# Altium footprint library SAMTEC THD.PcbLib: 161 footprints (part 9 of 12) (continued)
## SAMTEC_TSW-105-07-L-D-LL [mm] "10 Contacts, Pitch 2.54mm - Dual Row, Through Mount Straigh Header"
height 11.05
pads (10):
  round 1.7 hole 1: 1(-5.08,-1.27) 2(-5.08,1.27) 3(-2.54,-1.27) 4(-2.54,1.27) 5(0,-1.27) 6(0,1.27) 7(2.54,-1.27) 8(2.54,1.27) 9(5.08,-1.27) 10(5.08,1.27)
Top Overlay:
  circle w0.3: c-5.045,-3.135 r0.15
  lines w0.2: -6.35,-2.54 -6.35,2.54 ; -6.35,-2.54 -6.35,2.54 ; -6.35,-2.54 -4.064,-2.54 -4.064,-2.032 -3.556,-2.032 -3.556,-2.54 -1.524,-2.54 -1.524,-2.032 -1.016,-2.032 -1.016,-2.54 1.016,-2.54 1.016,-2.032 1.524,-2.032 1.524,-2.54 3.556,-2.54 3.556,-2.032 4.064,-2.032 4.064,-2.54 6.35,-2.54 ; -6.35,2.54 -4.064,2.54 -4.064,2.032 -3.556,2.032 -3.556,2.54 -1.524,2.54 -1.524,2.032 -1.016,2.032 -1.016,2.54 1.016,2.54 1.016,2.032 1.524,2.032 1.524,2.54 3.556,2.54 3.556,2.032 4.064,2.032 4.064,2.54 6.35,2.54 ; 6.35,-2.54 6.35,2.54 ; 6.35,-2.54 6.35,2.54
  text "1" at -7.327,-1.768 h1.2
Mechanical 8:
  lines w0.1: -5.58,-1.27 -5.08,-1.27 ; -5.58,1.27 -5.08,1.27 ; -5.08,-1.77 -5.08,-1.27 ; -5.08,-0.77 -5.08,-1.27 ; -5.08,0.77 -5.08,1.27 ; -5.08,1.77 -5.08,1.27 ; -4.58,-1.27 -5.08,-1.27 ; -4.58,1.27 -5.08,1.27 ; -3.04,-1.27 -2.54,-1.27 ; -3.04,1.27 -2.54,1.27 ; -2.54,-1.77 -2.54,-1.27 ; -2.54,-0.77 -2.54,-1.27 ; -2.54,0.77 -2.54,1.27 ; -2.54,1.77 -2.54,1.27 ; -2.04,-1.27 -2.54,-1.27 ; -2.04,1.27 -2.54,1.27 ; -0.5,-1.27 0,-1.27 ; -0.5,0 0,0 ; -0.5,1.27 0,1.27 ; 0,-1.77 0,-1.27 ; 0,-0.77 0,-1.27 ; 0,-0.5 0,0 ; 0,0.5 0,0 ; 0,0.77 0,1.27 ; 0,1.77 0,1.27 ; 0.5,-1.27 0,-1.27 ; 0.5,0 0,0 ; 0.5,1.27 0,1.27 ; 2.04,-1.27 2.54,-1.27 ; 2.04,1.27 2.54,1.27 ; 2.54,-1.77 2.54,-1.27 ; 2.54,-0.77 2.54,-1.27 ; 2.54,0.77 2.54,1.27 ; 2.54,1.77 2.54,1.27 ; 3.04,-1.27 2.54,-1.27 ; 3.04,1.27 2.54,1.27 ; 4.58,-1.27 5.08,-1.27 ; 4.58,1.27 5.08,1.27 ; 5.08,-1.77 5.08,-1.27 ; 5.08,-0.77 5.08,-1.27 ; 5.08,0.77 5.08,1.27 ; 5.08,1.77 5.08,1.27 ; 5.58,-1.27 5.08,-1.27 ; 5.58,1.27 5.08,1.27
Mechanical 14:
  drawing of 158 lines, arcs and shapes, not listed
  text "1" at -7.327,-1.768 h1.2
3D body "SAMTEC_TSW-105-07-L-D-LL.stp": height 8.38, standoff -2.54, extent -6.35,-2.54 6.35,2.54

## SAMTEC_TSW-105-23-L-D [mm] "10 Contacts - Pitch 2.54mm - Dual Row  Through Mount Straigh Header (Post Lead 5.84mm, Tail Lead 2.92mm, Insulator 2.54mm)"
height 8.38
pads (10):
  round 1.7 hole 1: 1(-5.08,-1.27) 2(-5.08,1.27) 3(-2.54,-1.27) 4(-2.54,1.27) 5(0,-1.27) 6(0,1.27) 7(2.54,-1.27) 8(2.54,1.27) 9(5.08,-1.27) 10(5.08,1.27)
Top Overlay:
  circle w0.3: c-5.045,-3.135 r0.15
  lines w0.2: -6.35,-2.54 -6.35,2.54 -4.064,2.54 -4.064,2.286 -3.556,2.286 -3.556,2.54 -1.524,2.54 -1.524,2.286 -1.016,2.286 -1.016,2.54 1.016,2.54 1.016,2.286 1.524,2.286 1.524,2.54 3.556,2.54 3.556,2.286 4.064,2.286 4.064,2.54 6.35,2.54 6.35,-2.54 4.064,-2.54 4.064,-2.286 3.556,-2.286 3.556,-2.54 1.524,-2.54 1.524,-2.286 1.016,-2.286 1.016,-2.54 -1.016,-2.54 -1.016,-2.286 -1.524,-2.286 -1.524,-2.54 -3.556,-2.54 -3.556,-2.286 -4.064,-2.286 -4.064,-2.54 -6.35,-2.54
  text "1" at -7.452,-1.768 h1.2
Mechanical 8:
  lines w0.05: -5.58,-1.27 -5.08,-1.27 ; -5.58,1.27 -5.08,1.27 ; -5.08,-1.77 -5.08,-1.27 ; -5.08,-0.77 -5.08,-1.27 ; -5.08,0.77 -5.08,1.27 ; -5.08,1.77 -5.08,1.27 ; -4.58,-1.27 -5.08,-1.27 ; -4.58,1.27 -5.08,1.27 ; -3.04,-1.27 -2.54,-1.27 ; -3.04,1.27 -2.54,1.27 ; -2.54,-1.77 -2.54,-1.27 ; -2.54,-0.77 -2.54,-1.27 ; -2.54,0.77 -2.54,1.27 ; -2.54,1.77 -2.54,1.27 ; -2.04,-1.27 -2.54,-1.27 ; -2.04,1.27 -2.54,1.27 ; -0.5,-1.27 0,-1.27 ; -0.5,0 0,0 ; -0.5,1.27 0,1.27 ; 0,-1.77 0,-1.27 ; 0,-0.77 0,-1.27 ; 0,-0.5 0,0 ; 0,0.5 0,0 ; 0,0.77 0,1.27 ; 0,1.77 0,1.27 ; 0.5,-1.27 0,-1.27 ; 0.5,0 0,0 ; 0.5,1.27 0,1.27 ; 2.04,-1.27 2.54,-1.27 ; 2.04,1.27 2.54,1.27 ; 2.54,-1.77 2.54,-1.27 ; 2.54,-0.77 2.54,-1.27 ; 2.54,0.77 2.54,1.27 ; 2.54,1.77 2.54,1.27 ; 3.04,-1.27 2.54,-1.27 ; 3.04,1.27 2.54,1.27 ; 4.58,-1.27 5.08,-1.27 ; 4.58,1.27 5.08,1.27 ; 5.08,-1.77 5.08,-1.27 ; 5.08,-0.77 5.08,-1.27 ; 5.08,0.77 5.08,1.27 ; 5.08,1.77 5.08,1.27 ; 5.58,-1.27 5.08,-1.27 ; 5.58,1.27 5.08,1.27
Mechanical 14:
  lines w0.1: -4.064,-2.286 -3.556,-2.286 ; -4.064,-0.508 -3.556,-0.508 ; -4.064,0.508 -3.556,0.508 ; -4.064,2.286 -3.556,2.286 ; -1.524,-2.286 -1.016,-2.286 ; -1.524,-0.508 -1.016,-0.508 ; -1.524,0.508 -1.016,0.508 ; -1.524,2.286 -1.016,2.286 ; 1.016,-2.286 1.524,-2.286 ; 1.016,-0.508 1.524,-0.508 ; 1.016,0.508 1.524,0.508 ; 1.016,2.286 1.524,2.286 ; 3.556,-2.286 4.064,-2.286 ; 3.556,-0.508 4.064,-0.508 ; 3.556,0.508 4.064,0.508 ; 3.556,2.286 4.064,2.286 ; -6.35,-2.54 -4.064,-2.54 -4.064,2.54 -6.35,2.54 -6.35,-2.54 ; -3.556,-2.54 -1.524,-2.54 -1.524,2.54 -3.556,2.54 -3.556,-2.54 ; -1.016,-2.54 1.016,-2.54 1.016,2.54 -1.016,2.54 -1.016,-2.54 ; 1.524,-2.54 3.556,-2.54 3.556,2.54 1.524,2.54 1.524,-2.54 ; 4.064,-2.54 6.35,-2.54 6.35,2.54 4.064,2.54 4.064,-2.54
3D body "SAMTEC_TSW-105-23-L-D.stp": height 8.38, standoff -2.92, extent -6.35,-2.54 6.35,2.54

## SAMTEC_TSW-105-23-L-S [mm] "5 Contacts - Pitch 2.54mm - Single Row  Through Mount Straigh Header (Post Lead 5.84mm, Tail Lead 2.92mm, Insulator 2.54mm)"
height 8.38
pads (5):
  rect 1.7x1.7 hole 1: 1(0,0)
  round 1.7 hole 1: 2(2.54,0) 3(5.08,0) 4(7.62,0) 5(10.16,0)
Top Overlay:
  circle w0.3: c-0.508,1.778 r0.15
  lines w0.2: 1.007,-1.2 1.007,-1.27 ; 1.007,1.2 1.007,1.27 ; 1.2,-0.762 1.533,-0.762 1.533,-1.27 3.547,-1.27 3.547,-0.762 4.073,-0.762 4.073,-1.27 6.087,-1.27 6.087,-0.762 6.613,-0.762 6.613,-1.27 8.627,-1.27 8.627,-0.762 ; 1.2,0.762 1.533,0.762 1.533,1.27 3.547,1.27 3.547,0.762 4.073,0.762 4.073,1.27 6.087,1.27 6.087,0.762 6.613,0.762 6.613,1.27 8.627,1.27 8.627,0.762 ; -1.27,-1.27 1.007,-1.27 ; -1.27,-1.27 -1.27,1.27 ; -1.27,-1.27 -1.27,1.27 ; -1.27,-1.27 1.007,-1.27 ; -1.27,1.27 1.007,1.27 ; -1.27,1.27 1.007,1.27 ; 8.627,-0.762 9.153,-0.762 ; 8.627,-0.762 9.153,-0.762 ; 8.627,0.762 9.153,0.762 ; 8.627,0.762 9.153,0.762 ; 9.153,-0.762 9.153,-1.27 11.43,-1.27 11.43,1.27 9.153,1.27 9.153,0.762
Mechanical 8:
  lines w0.1: -0.5,0 0,0 ; 0,-0.5 0,0 ; 0,0.5 0,0 ; 0.5,0 0,0 ; 2.04,0 2.54,0 ; 2.54,-0.5 2.54,0 ; 2.54,0.5 2.54,0 ; 3.04,0 2.54,0 ; 4.58,0 5.08,0 ; 5.08,-0.5 5.08,0 ; 5.08,0.5 5.08,0 ; 5.58,0 5.08,0 ; 7.12,0 7.62,0 ; 7.62,-0.5 7.62,0 ; 7.62,0.5 7.62,0 ; 8.12,0 7.62,0 ; 9.66,0 10.16,0 ; 10.16,-0.5 10.16,0 ; 10.16,0.5 10.16,0 ; 10.66,0 10.16,0
Mechanical 14:
  circle w0.3: c-0.508,1.778 r0.15
  lines w0.1: 1.007,-0.762 1.533,-0.762 ; 1.007,0.762 1.533,0.762 ; 3.547,-0.762 4.073,-0.762 ; 3.547,0.762 4.073,0.762 ; 6.087,-0.762 6.613,-0.762 ; 6.087,0.762 6.613,0.762 ; -1.27,-1.27 -1.27,1.27 1.007,1.27 1.007,-1.27 -1.27,-1.27 ; -0.317,-0.318 -0.318,0.317 0.317,0.317 0.318,-0.317 -0.317,-0.318 ; 1.533,-1.27 3.547,-1.27 3.547,1.27 1.533,1.27 1.533,-1.27 ; 2.223,-0.318 2.222,0.317 2.857,0.317 2.857,-0.317 2.223,-0.318 ; 4.073,-1.27 4.073,1.27 6.087,1.27 6.087,-1.27 4.073,-1.27 ; 4.763,-0.318 4.763,0.317 5.397,0.317 5.397,-0.317 4.763,-0.318 ; 6.613,-1.27 6.613,1.27 8.627,1.27 8.627,-1.27 6.613,-1.27 ; 7.303,-0.318 7.302,0.317 7.937,0.317 7.938,-0.317 7.303,-0.318 ; 8.627,-0.762 9.153,-0.762 8.627,-0.762 ; 8.627,0.762 9.153,0.762 8.627,0.762 ; 9.153,-1.27 9.153,1.27 11.43,1.27 11.43,-1.27 9.153,-1.27 ; 9.843,-0.318 9.843,0.317 10.478,0.317 10.478,-0.318 9.843,-0.318
3D body "SAMTEC_TSW-105-23-L-S.stp": height 8.38, standoff -2.92, extent -1.27,-1.27 11.43,1.27

## SAMTEC_TSW-106-22-L-D-RA [mm] "12 Contacts - Pitch 2.54mm - Dual Row Through Mount  Right Angle Header (Post Lead 5.84mm, Tail Lead 4.84mm)"
height 5.56
pads (12):
  round 1.7 hole 1: 1(-6.35,-1.27) 2(-6.35,1.27) 3(-3.81,-1.27) 4(-3.81,1.27) 5(-1.27,-1.27) 6(-1.27,1.27) 7(1.27,-1.27) 8(1.27,1.27) 9(3.81,-1.27) 10(3.81,1.27) 11(6.35,-1.27) 12(6.35,1.27)
Top Overlay:
  circle w0.3: c-6.315,-3.135 r0.15
  lines w0.2: -6.667,2.479 -6.667,3.302 ; -6.667,5.334 -6.667,11.176 -6.032,11.176 -6.032,5.334 ; -6.032,2.479 -6.032,3.302 ; -5.344,3.581 -4.816,3.581 ; -5.344,5.055 -4.816,5.055 ; -4.127,2.479 -4.127,3.302 ; -4.127,5.334 -4.127,11.176 -3.492,11.176 -3.492,5.334 ; -3.492,2.479 -3.492,3.302 ; -2.804,3.581 -2.276,3.581 ; -2.804,5.055 -2.276,5.055 ; -1.587,2.479 -1.587,3.302 ; -1.587,5.334 -1.587,11.176 -0.952,11.176 -0.952,5.334 ; -0.952,2.479 -0.952,3.302 ; -0.264,3.581 0.264,3.581 ; -0.264,5.055 0.264,5.055 ; 0.953,2.479 0.953,3.302 ; 0.953,5.334 0.953,11.176 1.588,11.176 1.588,5.334 ; 1.588,2.479 1.588,3.302 ; 2.276,3.581 2.804,3.581 ; 2.276,5.055 2.804,5.055 ; 3.493,2.479 3.493,3.302 ; 3.493,5.334 3.493,11.176 4.128,11.176 4.128,5.334 ; 4.128,2.479 4.128,3.302 ; 4.816,3.581 5.344,3.581 ; 4.816,5.055 5.344,5.055 ; 6.033,2.479 6.033,3.302 ; 6.033,5.334 6.033,11.176 6.668,11.176 6.668,5.334 ; 6.668,2.479 6.668,3.302 ; -7.62,3.302 -7.356,3.302 -7.356,2.794 -6.924,2.794 -6.924,3.302 -5.776,3.302 -5.776,2.794 -5.344,2.794 -5.344,5.334 -7.62,5.334 -7.62,3.302 ; -4.816,2.794 -4.384,2.794 -4.384,3.302 -3.236,3.302 -3.236,2.794 -2.804,2.794 -2.804,5.334 -4.816,5.334 -4.816,2.794 ; -2.276,2.794 -1.844,2.794 -1.844,3.302 -0.696,3.302 -0.696,2.794 -0.264,2.794 -0.264,5.334 -2.276,5.334 -2.276,2.794 ; 0.264,2.794 0.696,2.794 0.696,3.302 1.844,3.302 1.844,2.794 2.276,2.794 2.276,5.334 0.264,5.334 0.264,2.794 ; 2.804,2.794 3.236,2.794 3.236,3.302 4.384,3.302 4.384,2.794 4.816,2.794 4.816,5.334 2.804,5.334 2.804,2.794 ; 5.344,2.794 5.776,2.794 5.776,3.302 6.924,3.302 6.924,2.794 7.356,2.794 7.356,3.302 7.62,3.302 7.62,5.334 5.344,5.334 5.344,2.794
  text "1" at -8.597,-1.768 h1.2
Mechanical 8:
  lines w0.1: -6.85,-1.27 -6.35,-1.27 ; -6.85,1.27 -6.35,1.27 ; -6.35,-1.77 -6.35,-1.27 ; -6.35,-0.77 -6.35,-1.27 ; -6.35,0.77 -6.35,1.27 ; -6.35,1.77 -6.35,1.27 ; -5.85,-1.27 -6.35,-1.27 ; -5.85,1.27 -6.35,1.27 ; -4.31,-1.27 -3.81,-1.27 ; -4.31,1.27 -3.81,1.27 ; -3.81,-1.77 -3.81,-1.27 ; -3.81,-0.77 -3.81,-1.27 ; -3.81,0.77 -3.81,1.27 ; -3.81,1.77 -3.81,1.27 ; -3.31,-1.27 -3.81,-1.27 ; -3.31,1.27 -3.81,1.27 ; -1.77,-1.27 -1.27,-1.27 ; -1.77,1.27 -1.27,1.27 ; -1.27,-1.77 -1.27,-1.27 ; -1.27,-0.77 -1.27,-1.27 ; -1.27,0.77 -1.27,1.27 ; -1.27,1.77 -1.27,1.27 ; -0.77,-1.27 -1.27,-1.27 ; -0.77,1.27 -1.27,1.27 ; -0.5,0 0,0 ; 0,-0.5 0,0 ; 0,0.5 0,0 ; 0.5,0 0,0 ; 0.77,-1.27 1.27,-1.27 ; 0.77,1.27 1.27,1.27 ; 1.27,-1.77 1.27,-1.27 ; 1.27,-0.77 1.27,-1.27 ; 1.27,0.77 1.27,1.27 ; 1.27,1.77 1.27,1.27 ; 1.77,-1.27 1.27,-1.27 ; 1.77,1.27 1.27,1.27 ; 3.31,-1.27 3.81,-1.27 ; 3.31,1.27 3.81,1.27 ; 3.81,-1.77 3.81,-1.27 ; 3.81,-0.77 3.81,-1.27 ; 3.81,0.77 3.81,1.27 ; 3.81,1.77 3.81,1.27 ; 4.31,-1.27 3.81,-1.27 ; 4.31,1.27 3.81,1.27 ; 5.85,-1.27 6.35,-1.27 ; 5.85,1.27 6.35,1.27 ; 6.35,-1.77 6.35,-1.27 ; 6.35,-0.77 6.35,-1.27 ; 6.35,0.77 6.35,1.27 ; 6.35,1.77 6.35,1.27 ; 6.85,-1.27 6.35,-1.27 ; 6.85,1.27 6.35,1.27
Mechanical 14:
  circle w0.3: c-6.315,-3.135 r0.15
  lines w0.1: -6.667,3.302 -6.667,-1.587 -6.032,-1.587 -6.032,3.302 ; -6.667,5.334 -6.667,11.176 -6.032,11.176 -6.032,5.334 ; -5.344,3.581 -4.816,3.581 ; -5.344,5.055 -4.816,5.055 ; -4.127,3.302 -4.127,-1.587 -3.492,-1.587 -3.492,3.302 ; -4.127,5.334 -4.127,11.176 -3.492,11.176 -3.492,5.334 ; -2.804,3.581 -2.276,3.581 ; -2.804,5.055 -2.276,5.055 ; -1.587,3.302 -1.587,-1.587 -0.952,-1.587 -0.952,3.302 ; -1.587,5.334 -1.587,11.176 -0.952,11.176 -0.952,5.334 ; -0.264,3.581 0.264,3.581 ; -0.264,5.055 0.264,5.055 ; 0.953,3.302 0.953,-1.587 1.588,-1.587 1.588,3.302 ; 0.953,5.334 0.953,11.176 1.588,11.176 1.588,5.334 ; 2.276,3.581 2.804,3.581 ; 2.276,5.055 2.804,5.055 ; 3.493,3.302 3.493,-1.587 4.128,-1.587 4.128,3.302 ; 3.493,5.334 3.493,11.176 4.128,11.176 4.128,5.334 ; 4.816,3.581 5.344,3.581 ; 4.816,5.055 5.344,5.055 ; 6.033,3.302 6.033,-1.587 6.668,-1.587 6.668,3.302 ; 6.033,5.334 6.033,11.176 6.668,11.176 6.668,5.334 ; -7.62,3.302 -7.356,3.302 -7.356,2.794 -6.924,2.794 -6.924,3.302 -5.776,3.302 -5.776,2.794 -5.344,2.794 -5.344,5.334 -7.62,5.334 -7.62,3.302 ; -4.816,2.794 -4.384,2.794 -4.384,3.302 -3.236,3.302 -3.236,2.794 -2.804,2.794 -2.804,5.334 -4.816,5.334 -4.816,2.794 ; -2.276,2.794 -1.844,2.794 -1.844,3.302 -0.696,3.302 -0.696,2.794 -0.264,2.794 -0.264,5.334 -2.276,5.334 -2.276,2.794 ; 0.264,2.794 0.696,2.794 0.696,3.302 1.844,3.302 1.844,2.794 2.276,2.794 2.276,5.334 0.264,5.334 0.264,2.794 ; 2.804,2.794 3.236,2.794 3.236,3.302 4.384,3.302 4.384,2.794 4.816,2.794 4.816,5.334 2.804,5.334 2.804,2.794 ; 5.344,2.794 5.776,2.794 5.776,3.302 6.924,3.302 6.924,2.794 7.356,2.794 7.356,3.302 7.62,3.302 7.62,5.334 5.344,5.334 5.344,2.794
  text "1" at -8.597,-1.768 h1.2
3D body "SAMTEC_TSW-106-22-L-D-RA.stp": height 5.59, standoff -4.83, extent -7.62,-1.587 7.62,11.176

## SAMTEC_TSW-106-23-L-D [mm] "12 Contacts - Pitch 2.54mm - Dual Row  Through Mount Straigh Header (Post Lead 5.84mm, Tail Lead 2.92mm, Insulator 2.54mm)"
height 8.38
pads (12):
  round 1.7 hole 1: 1(-6.35,-1.27) 2(-6.35,1.27) 3(-3.81,-1.27) 4(-3.81,1.27) 5(-1.27,-1.27) 6(-1.27,1.27) 7(1.27,-1.27) 8(1.27,1.27) 9(3.81,-1.27) 10(3.81,1.27) 11(6.35,-1.27) 12(6.35,1.27)
Top Overlay:
  circle w0.3: c-6.315,-3.135 r0.15
  lines w0.2: -7.62,-2.54 -7.62,2.54 -5.334,2.54 -5.334,2.286 -4.826,2.286 -4.826,2.54 -2.794,2.54 -2.794,2.286 -2.286,2.286 -2.286,2.54 -0.254,2.54 -0.254,2.286 0.254,2.286 0.254,2.54 2.286,2.54 2.286,2.286 2.794,2.286 2.794,2.54 4.826,2.54 4.826,2.286 5.334,2.286 5.334,2.54 7.62,2.54 7.62,-2.54 5.334,-2.54 5.334,-2.286 4.826,-2.286 4.826,-2.54 2.794,-2.54 2.794,-2.286 2.286,-2.286 2.286,-2.54 0.254,-2.54 0.254,-2.286 -0.254,-2.286 -0.254,-2.54 -2.286,-2.54 -2.286,-2.286 -2.794,-2.286 -2.794,-2.54 -4.826,-2.54 -4.826,-2.286 -5.334,-2.286 -5.334,-2.54 -7.62,-2.54
  text "1" at -8.722,-1.768 h1.2
Mechanical 8:
  lines w0.05: -6.85,-1.27 -6.35,-1.27 ; -6.85,1.27 -6.35,1.27 ; -6.35,-1.77 -6.35,-1.27 ; -6.35,-0.77 -6.35,-1.27 ; -6.35,0.77 -6.35,1.27 ; -6.35,1.77 -6.35,1.27 ; -5.85,-1.27 -6.35,-1.27 ; -5.85,1.27 -6.35,1.27 ; -4.31,-1.27 -3.81,-1.27 ; -4.31,1.27 -3.81,1.27 ; -3.81,-1.77 -3.81,-1.27 ; -3.81,-0.77 -3.81,-1.27 ; -3.81,0.77 -3.81,1.27 ; -3.81,1.77 -3.81,1.27 ; -3.31,-1.27 -3.81,-1.27 ; -3.31,1.27 -3.81,1.27 ; -1.77,-1.27 -1.27,-1.27 ; -1.77,1.27 -1.27,1.27 ; -1.27,-1.77 -1.27,-1.27 ; -1.27,-0.77 -1.27,-1.27 ; -1.27,0.77 -1.27,1.27 ; -1.27,1.77 -1.27,1.27 ; -0.77,-1.27 -1.27,-1.27 ; -0.77,1.27 -1.27,1.27 ; -0.5,0 0,0 ; 0,-0.5 0,0 ; 0,0.5 0,0 ; 0.5,0 0,0 ; 0.77,-1.27 1.27,-1.27 ; 0.77,1.27 1.27,1.27 ; 1.27,-1.77 1.27,-1.27 ; 1.27,-0.77 1.27,-1.27 ; 1.27,0.77 1.27,1.27 ; 1.27,1.77 1.27,1.27 ; 1.77,-1.27 1.27,-1.27 ; 1.77,1.27 1.27,1.27 ; 3.31,-1.27 3.81,-1.27 ; 3.31,1.27 3.81,1.27 ; 3.81,-1.77 3.81,-1.27 ; 3.81,-0.77 3.81,-1.27 ; 3.81,0.77 3.81,1.27 ; 3.81,1.77 3.81,1.27 ; 4.31,-1.27 3.81,-1.27 ; 4.31,1.27 3.81,1.27 ; 5.85,-1.27 6.35,-1.27 ; 5.85,1.27 6.35,1.27 ; 6.35,-1.77 6.35,-1.27 ; 6.35,-0.77 6.35,-1.27 ; 6.35,0.77 6.35,1.27 ; 6.35,1.77 6.35,1.27 ; 6.85,-1.27 6.35,-1.27 ; 6.85,1.27 6.35,1.27
Mechanical 14:
  lines w0.1: -5.334,-2.286 -4.826,-2.286 ; -5.334,-0.508 -4.826,-0.508 ; -5.334,0.508 -4.826,0.508 ; -5.334,2.286 -4.826,2.286 ; -2.794,-2.286 -2.286,-2.286 ; -2.794,-0.508 -2.286,-0.508 ; -2.794,0.508 -2.286,0.508 ; -2.794,2.286 -2.286,2.286 ; -0.254,-2.286 0.254,-2.286 ; -0.254,-0.508 0.254,-0.508 ; -0.254,0.508 0.254,0.508 ; -0.254,2.286 0.254,2.286 ; 2.286,-2.286 2.794,-2.286 ; 2.286,-0.508 2.794,-0.508 ; 2.286,0.508 2.794,0.508 ; 2.286,2.286 2.794,2.286 ; 4.826,-2.286 5.334,-2.286 ; 4.826,-0.508 5.334,-0.508 ; 4.826,0.508 5.334,0.508 ; 4.826,2.286 5.334,2.286 ; -7.62,-2.54 -5.334,-2.54 -5.334,2.54 -7.62,2.54 -7.62,-2.54 ; -4.826,-2.54 -2.794,-2.54 -2.794,2.54 -4.826,2.54 -4.826,-2.54 ; -2.286,-2.54 -0.254,-2.54 -0.254,2.54 -2.286,2.54 -2.286,-2.54 ; 0.254,-2.54 2.286,-2.54 2.286,2.54 0.254,2.54 0.254,-2.54 ; 2.794,-2.54 4.826,-2.54 4.826,2.54 2.794,2.54 2.794,-2.54 ; 5.334,-2.54 7.62,-2.54 7.62,2.54 5.334,2.54 5.334,-2.54
3D body "SAMTEC_TSW-106-23-L-D.stp": height 8.38, standoff -2.92, extent -7.62,-2.54 7.62,2.54

## SAMTEC_TSW-106-23-L-S [mm] "6 Contacts - Pitch 2.54mm - Single Row  Through Mount Straigh Header (Post Lead = 5.84mm, Tail Lead 2.92mm, Insulator 2.54mm)"
height 8.38
pads (6):
  rect 1.7x1.7 hole 1: 1(0,0)
  round 1.7 hole 1: 2(2.54,0) 3(5.08,0) 4(7.62,0) 5(10.16,0) 6(12.7,0)
Top Overlay:
  circle w0.3: c-0.508,1.778 r0.15
  lines w0.2: 1.007,-1.2 1.007,-1.27 ; 1.007,1.2 1.007,1.27 ; 1.2,-0.762 1.533,-0.762 1.533,-1.27 3.547,-1.27 3.547,-0.762 4.073,-0.762 4.073,-1.27 6.087,-1.27 6.087,-0.762 6.613,-0.762 6.613,-1.27 8.627,-1.27 8.627,-0.762 9.153,-0.762 9.153,-1.27 11.167,-1.27 11.167,-0.762 ; 1.2,0.762 1.533,0.762 1.533,1.27 3.547,1.27 3.547,0.762 4.073,0.762 4.073,1.27 6.087,1.27 6.087,0.762 6.613,0.762 6.613,1.27 8.627,1.27 8.627,0.762 9.153,0.762 9.153,1.27 11.167,1.27 11.167,0.762 ; -1.27,-1.27 1.007,-1.27 ; -1.27,-1.27 -1.27,1.27 ; -1.27,-1.27 -1.27,1.27 ; -1.27,-1.27 1.007,-1.27 ; -1.27,1.27 1.007,1.27 ; -1.27,1.27 1.007,1.27 ; 11.167,-0.762 11.693,-0.762 ; 11.167,-0.762 11.693,-0.762 ; 11.167,0.762 11.693,0.762 ; 11.167,0.762 11.693,0.762 ; 11.693,-0.762 11.693,-1.27 13.97,-1.27 13.97,1.27 11.693,1.27 11.693,0.762
Mechanical 8:
  lines w0.1: -0.5,0 0,0 ; 0,-0.5 0,0 ; 0,0.5 0,0 ; 0.5,0 0,0 ; 2.04,0 2.54,0 ; 2.54,-0.5 2.54,0 ; 2.54,0.5 2.54,0 ; 3.04,0 2.54,0 ; 4.58,0 5.08,0 ; 5.08,-0.5 5.08,0 ; 5.08,0.5 5.08,0 ; 5.58,0 5.08,0 ; 7.12,0 7.62,0 ; 7.62,-0.5 7.62,0 ; 7.62,0.5 7.62,0 ; 8.12,0 7.62,0 ; 9.66,0 10.16,0 ; 10.16,-0.5 10.16,0 ; 10.16,0.5 10.16,0 ; 10.66,0 10.16,0 ; 12.2,0 12.7,0 ; 12.7,-0.5 12.7,0 ; 12.7,0.5 12.7,0 ; 13.2,0 12.7,0
Mechanical 14:
  circle w0.3: c-0.508,1.778 r0.15
  lines w0.1: 1.007,-0.762 1.533,-0.762 ; 1.007,0.762 1.533,0.762 ; 3.547,-0.762 4.073,-0.762 ; 3.547,0.762 4.073,0.762 ; 6.087,-0.762 6.613,-0.762 ; 6.087,0.762 6.613,0.762 ; 8.627,-0.762 9.153,-0.762 ; 8.627,0.762 9.153,0.762 ; -1.27,-1.27 1.007,-1.27 1.007,1.27 -1.27,1.27 -1.27,-1.27 ; -0.317,-0.318 0.318,-0.318 0.317,0.317 -0.318,0.317 -0.317,-0.318 ; 1.533,-1.27 1.533,1.27 3.547,1.27 3.547,-1.27 1.533,-1.27 ; 2.223,-0.318 2.858,-0.318 2.857,0.317 2.222,0.317 2.223,-0.318 ; 4.073,-1.27 6.087,-1.27 6.087,1.27 4.073,1.27 4.073,-1.27 ; 4.763,-0.318 5.398,-0.318 5.397,0.317 4.763,0.317 4.763,-0.318 ; 6.613,-1.27 6.613,1.27 8.627,1.27 8.627,-1.27 6.613,-1.27 ; 7.303,-0.318 7.302,0.317 7.937,0.317 7.938,-0.317 7.303,-0.318 ; 9.153,-1.27 11.167,-1.27 11.167,1.27 9.153,1.27 9.153,-1.27 ; 9.843,-0.318 10.478,-0.318 10.477,0.317 9.842,0.317 9.843,-0.318 ; 11.167,-0.762 11.693,-0.762 11.167,-0.762 ; 11.167,0.762 11.693,0.762 11.167,0.762 ; 11.693,-1.27 13.97,-1.27 13.97,1.27 11.693,1.27 11.693,-1.27 ; 12.383,-0.318 13.018,-0.318 13.018,0.317 12.383,0.317 12.383,-0.318
3D body "SAMTEC_TSW-106-23-L-S.stp": height 8.38, standoff -2.92, extent -1.27,-1.27 13.97,1.27

## SAMTEC_TSW-107-07-L-S-LL [mm] "7 Contacts - Pitch 2.54mm - Single Row  Through Mount Straigh Header (Post Lead 5.84mm, Tail Lead 2.54mm, Insulator 2.54mm)"
height 8.38
pads (7):
  rect 1.7x1.7 hole 1: 1(0,0)
  round 1.7 hole 1: 2(2.54,0) 3(5.08,0) 4(7.62,0) 5(10.16,0) 6(12.7,0) 7(15.24,0)
Top Overlay:
  circle w0.3: c-0.508,1.778 r0.15
  lines w0.2: 1.007,-1.2 1.007,-1.27 -1.27,-1.27 -1.27,1.27 1.007,1.27 1.007,1.2 ; 1.2,-0.762 1.533,-0.762 1.533,-1.27 3.547,-1.27 3.547,-0.762 4.073,-0.762 4.073,-1.27 6.087,-1.27 6.087,-0.762 6.613,-0.762 6.613,-1.27 8.627,-1.27 8.627,-0.762 9.153,-0.762 9.153,-1.27 11.167,-1.27 11.167,-0.762 11.693,-0.762 11.693,-1.27 13.707,-1.27 13.707,-0.762 ; 1.2,0.762 1.533,0.762 1.533,1.27 3.547,1.27 3.547,0.762 4.073,0.762 4.073,1.27 6.087,1.27 6.087,0.762 6.613,0.762 6.613,1.27 8.627,1.27 8.627,0.762 9.153,0.762 9.153,1.27 11.167,1.27 11.167,0.762 11.693,0.762 11.693,1.27 13.707,1.27 13.707,0.762 ; 13.707,-0.762 14.233,-0.762 ; 13.707,-0.762 14.233,-0.762 ; 13.707,0.762 14.233,0.762 ; 13.707,0.762 14.233,0.762 ; 14.233,-0.762 14.233,-1.27 16.51,-1.27 16.51,1.27 14.233,1.27 14.233,0.762
Mechanical 8:
  lines w0.1: -0.5,0 0,0 ; 0,-0.5 0,0 ; 0,0.5 0,0 ; 0.5,0 0,0 ; 2.04,0 2.54,0 ; 2.54,-0.5 2.54,0 ; 2.54,0.5 2.54,0 ; 3.04,0 2.54,0 ; 4.58,0 5.08,0 ; 5.08,-0.5 5.08,0 ; 5.08,0.5 5.08,0 ; 5.58,0 5.08,0 ; 7.12,0 7.62,0 ; 7.62,-0.5 7.62,0 ; 7.62,0.5 7.62,0 ; 8.12,0 7.62,0 ; 9.66,0 10.16,0 ; 10.16,-0.5 10.16,0 ; 10.16,0.5 10.16,0 ; 10.66,0 10.16,0 ; 12.2,0 12.7,0 ; 12.7,-0.5 12.7,0 ; 12.7,0.5 12.7,0 ; 13.2,0 12.7,0 ; 14.74,0 15.24,0 ; 15.24,-0.5 15.24,0 ; 15.24,0.5 15.24,0 ; 15.74,0 15.24,0
Mechanical 14:
  circle w0.3: c-0.508,1.778 r0.15
  lines w0.1: 1.007,-0.762 1.533,-0.762 ; 1.007,0.762 1.533,0.762 ; 3.547,-0.762 4.073,-0.762 ; 3.547,0.762 4.073,0.762 ; 6.087,-0.762 6.613,-0.762 ; 6.087,0.762 6.613,0.762 ; 8.627,-0.762 9.153,-0.762 ; 8.627,0.762 9.153,0.762 ; 11.167,-0.762 11.693,-0.762 ; 11.167,0.762 11.693,0.762 ; -1.27,-1.27 -1.27,1.27 1.007,1.27 1.007,-1.27 -1.27,-1.27 ; -0.317,-0.318 -0.318,0.317 0.317,0.317 0.318,-0.317 -0.317,-0.318 ; 1.533,-1.27 3.547,-1.27 3.547,1.27 1.533,1.27 1.533,-1.27 ; 2.223,-0.318 2.222,0.317 2.857,0.317 2.858,-0.317 2.223,-0.318 ; 4.073,-1.27 4.073,1.27 6.087,1.27 6.087,-1.27 4.073,-1.27 ; 4.763,-0.318 5.398,-0.318 5.397,0.317 4.763,0.317 4.763,-0.318 ; 6.613,-1.27 6.613,1.27 8.627,1.27 8.627,-1.27 6.613,-1.27 ; 7.303,-0.318 7.938,-0.318 7.937,0.317 7.303,0.317 7.303,-0.318 ; 9.153,-1.27 9.153,1.27 11.167,1.27 11.167,-1.27 9.153,-1.27 ; 9.843,-0.318 10.478,-0.318 10.477,0.317 9.843,0.317 9.843,-0.318 ; 11.693,-1.27 11.693,1.27 13.707,1.27 13.707,-1.27 11.693,-1.27 ; 12.383,-0.318 13.018,-0.318 13.017,0.317 12.383,0.317 12.383,-0.318 ; 13.707,-0.762 14.233,-0.762 13.707,-0.762 ; 13.707,0.762 14.233,0.762 13.707,0.762 ; 14.233,-1.27 14.233,1.27 16.51,1.27 16.51,-1.27 14.233,-1.27 ; 14.923,-0.318 14.923,0.317 15.558,0.317 15.558,-0.318 14.923,-0.318
3D body "SAMTEC_TSW-107-07-L-S-LL.stp": height 8.38, standoff -2.54, extent -1.27,-1.27 16.51,1.27